# Altium integrated library Weidmueller_OMNIMATE_Signal.IntLib: 2550 symbols (part 11 of 45) (continued)
## 1440400000_Single (continued)
OMNIMATE Signal - series RSV; PartNumber: 1440400000; Manufacturer: Weidmueller; Short_text_for_material: RSV1,6 LS4 GR 3,2 AU; Side_termination_characteristic: closed side; Mounting_onto_the_PCB: Solder connection; Pitch_mm: 5 mm; Pitch_inch: 0.197 inch; No_of_poles: 4; Outgoing_elbow: 180°; Solder_pin_length_mm: 3.2 mm; Contact_material: Cu-Leg; Contact_surface: Gold-plated; Insulating_material: Wemid (PA); UL_94_flammability_rating: V-0; Rated_voltage_for_surge_voltage_class_pollution_degree_II_2: 500 V; Rated_current_min_no_of_poles_TU_20_deg_C: 32 A; PackageReference: RSV1_6_LS_04; Colour: Pebble grey; Packaging: Box; Qty: 100 PCS; Revision: V1; ComponentLink1Description: Manufacturer URL; ComponentLink1URL: http://www.weidmueller.com/; ComponentLink2Description: URL Link1; ComponentLink2URL: http://catalog.weidmueller.com/catalog/Start.do?localeId=en&ObjectID=1440400000
footprint RSV1_6_LS_04 (OMNIMATE Signal - Serie RSV  RSV1,6 LS4 GR 3,2)
part A pins: A1
part B pins: A2
part C pins: A3
part D pins: A4

## 1440500000
designator J?
OMNIMATE Signal - series RSV; PartNumber: 1440500000; Manufacturer: Weidmueller; Short_text_for_material: RSV1,6 LS4 GR 3,2 SN; Side_termination_characteristic: closed side; Mounting_onto_the_PCB: Solder connection; Pitch_mm: 5 mm; Pitch_inch: 0.197 inch; No_of_poles: 4; Outgoing_elbow: 180°; Solder_pin_length_mm: 3.2 mm; Contact_material: Cu-Leg; Contact_surface: tinned; Insulating_material: Wemid (PA); UL_94_flammability_rating: V-0; Rated_voltage_for_surge_voltage_class_pollution_degree_II_2: 500 V; Rated_current_min_no_of_poles_TU_20_deg_C: 32 A; PackageReference: RSV1_6_LS_04; Colour: Pebble grey; Packaging: Box; Qty: 100 PCS; Revision: V1; ComponentLink1Description: Manufacturer URL; ComponentLink1URL: http://www.weidmueller.com/; ComponentLink2Description: URL Link1; ComponentLink2URL: http://catalog.weidmueller.com/catalog/Start.do?localeId=en&ObjectID=1440500000
footprint RSV1_6_LS_04 (OMNIMATE Signal - Serie RSV  RSV1,6 LS4 GR 3,2)
pins: A1, A2, A3, A4

## 1440500000_Single
designator J?
OMNIMATE Signal - series RSV; PartNumber: 1440500000; Manufacturer: Weidmueller; Short_text_for_material: RSV1,6 LS4 GR 3,2 SN; Side_termination_characteristic: closed side; Mounting_onto_the_PCB: Solder connection; Pitch_mm: 5 mm; Pitch_inch: 0.197 inch; No_of_poles: 4; Outgoing_elbow: 180°; Solder_pin_length_mm: 3.2 mm; Contact_material: Cu-Leg; Contact_surface: tinned; Insulating_material: Wemid (PA); UL_94_flammability_rating: V-0; Rated_voltage_for_surge_voltage_class_pollution_degree_II_2: 500 V; Rated_current_min_no_of_poles_TU_20_deg_C: 32 A; PackageReference: RSV1_6_LS_04; Colour: Pebble grey; Packaging: Box; Qty: 100 PCS; Revision: V1; ComponentLink1Description: Manufacturer URL; ComponentLink1URL: http://www.weidmueller.com/; ComponentLink2Description: URL Link1; ComponentLink2URL: http://catalog.weidmueller.com/catalog/Start.do?localeId=en&ObjectID=1440500000
footprint RSV1_6_LS_04 (OMNIMATE Signal - Serie RSV  RSV1,6 LS4 GR 3,2)
part A pins: A1
part B pins: A2
part C pins: A3
part D pins: A4

## 1440600000
designator J?
OMNIMATE Signal - series RSV; PartNumber: 1440600000; Manufacturer: Weidmueller; Short_text_for_material: RSV1,6 LBF4 GR 3,2 AU; Pitch_mm: 5 mm; Pitch_inch: 0.197 inch; No_of_poles: 4; Solder_pin_length_mm: 3.2 mm; Contact_material: Cu-Leg; Contact_surface: Gold-plated; Insulating_material: Wemid (PA); UL_94_flammability_rating: V-0; Rated_voltage_for_surge_voltage_class_pollution_degree_II_2: 500 V; Rated_current_min_no_of_poles_TU_20_deg_C: 32 A; PackageReference: RSV1_6_LBF_04; Colour: Pebble grey; Packaging: Box; Qty: 100 PCS; Revision: V1; ComponentLink1Description: Manufacturer URL; ComponentLink1URL: http://www.weidmueller.com/; ComponentLink2Description: URL Link1; ComponentLink2URL: http://catalog.weidmueller.com/catalog/Start.do?localeId=en&ObjectID=1440600000
footprint RSV1_6_LBF_04 (OMNIMATE Signal - Serie RSV  RSV1,6 LBF4 GR 3,2)
pins: A1, A2, A3, A4

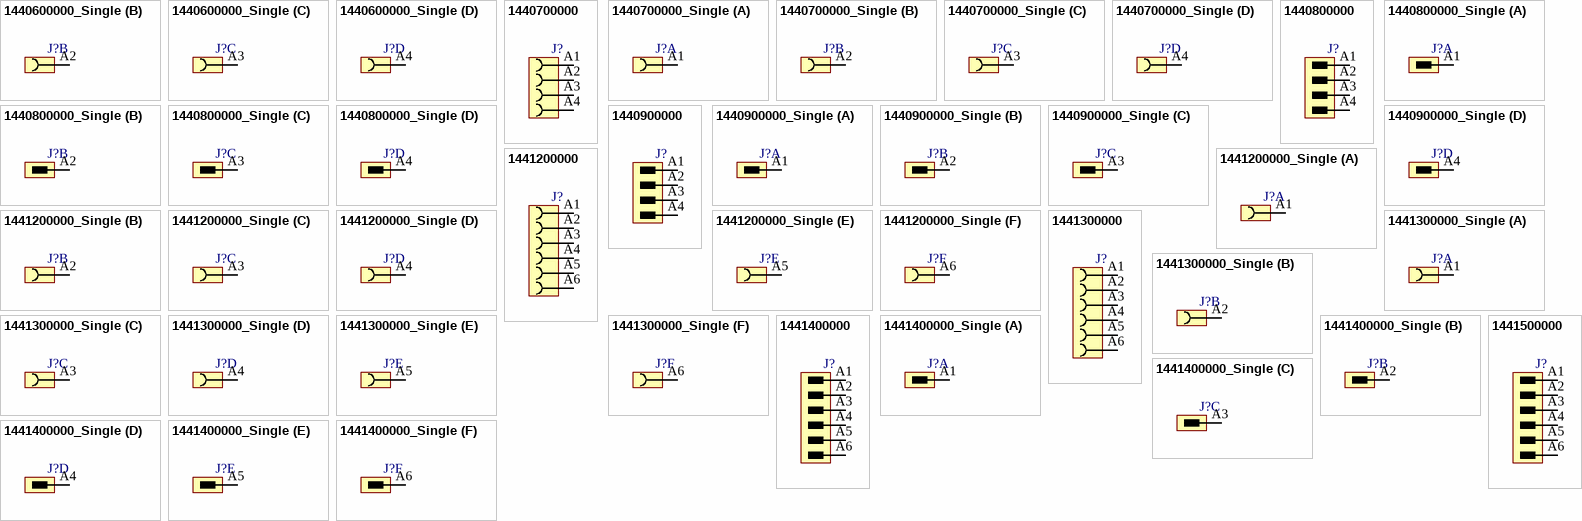
[diagram p63: symbols 1440600000_Single to 1441500000]

## 1440600000_Single
designator J?
OMNIMATE Signal - series RSV; PartNumber: 1440600000; Manufacturer: Weidmueller; Short_text_for_material: RSV1,6 LBF4 GR 3,2 AU; Pitch_mm: 5 mm; Pitch_inch: 0.197 inch; No_of_poles: 4; Solder_pin_length_mm: 3.2 mm; Contact_material: Cu-Leg; Contact_surface: Gold-plated; Insulating_material: Wemid (PA); UL_94_flammability_rating: V-0; Rated_voltage_for_surge_voltage_class_pollution_degree_II_2: 500 V; Rated_current_min_no_of_poles_TU_20_deg_C: 32 A; PackageReference: RSV1_6_LBF_04; Colour: Pebble grey; Packaging: Box; Qty: 100 PCS; Revision: V1; ComponentLink1Description: Manufacturer URL; ComponentLink1URL: http://www.weidmueller.com/; ComponentLink2Description: URL Link1; ComponentLink2URL: http://catalog.weidmueller.com/catalog/Start.do?localeId=en&ObjectID=1440600000
footprint RSV1_6_LBF_04 (OMNIMATE Signal - Serie RSV  RSV1,6 LBF4 GR 3,2)
part A pins: A1
part B pins: A2
part C pins: A3
part D pins: A4

## 1440700000
designator J?
OMNIMATE Signal - series RSV; PartNumber: 1440700000; Manufacturer: Weidmueller; Short_text_for_material: RSV1,6 LBF4 GR 3,2 SN; Pitch_mm: 5 mm; Pitch_inch: 0.197 inch; No_of_poles: 4; Solder_pin_length_mm: 3.2 mm; Contact_material: Cu-Leg; Contact_surface: tinned; Insulating_material: Wemid (PA); UL_94_flammability_rating: V-0; Rated_voltage_for_surge_voltage_class_pollution_degree_II_2: 500 V; Rated_current_min_no_of_poles_TU_20_deg_C: 32 A; PackageReference: RSV1_6_LBF_04; Colour: Pebble grey; Packaging: Box; Qty: 100 PCS; Revision: V1; ComponentLink1Description: Manufacturer URL; ComponentLink1URL: http://www.weidmueller.com/; ComponentLink2Description: URL Link1; ComponentLink2URL: http://catalog.weidmueller.com/catalog/Start.do?localeId=en&ObjectID=1440700000
footprint RSV1_6_LBF_04 (OMNIMATE Signal - Serie RSV  RSV1,6 LBF4 GR 3,2)
pins: A1, A2, A3, A4

## 1440700000_Single
designator J?
OMNIMATE Signal - series RSV; PartNumber: 1440700000; Manufacturer: Weidmueller; Short_text_for_material: RSV1,6 LBF4 GR 3,2 SN; Pitch_mm: 5 mm; Pitch_inch: 0.197 inch; No_of_poles: 4; Solder_pin_length_mm: 3.2 mm; Contact_material: Cu-Leg; Contact_surface: tinned; Insulating_material: Wemid (PA); UL_94_flammability_rating: V-0; Rated_voltage_for_surge_voltage_class_pollution_degree_II_2: 500 V; Rated_current_min_no_of_poles_TU_20_deg_C: 32 A; PackageReference: RSV1_6_LBF_04; Colour: Pebble grey; Packaging: Box; Qty: 100 PCS; Revision: V1; ComponentLink1Description: Manufacturer URL; ComponentLink1URL: http://www.weidmueller.com/; ComponentLink2Description: URL Link1; ComponentLink2URL: http://catalog.weidmueller.com/catalog/Start.do?localeId=en&ObjectID=1440700000
footprint RSV1_6_LBF_04 (OMNIMATE Signal - Serie RSV  RSV1,6 LBF4 GR 3,2)
part A pins: A1
part B pins: A2
part C pins: A3
part D pins: A4

## 1440800000
designator J?
OMNIMATE Signal - series RSV; PartNumber: 1440800000; Manufacturer: Weidmueller; Short_text_for_material: RSV1,6 LSF4 GR 3,2 AU; Side_termination_characteristic: Flange; Mounting_onto_the_PCB: Solder connection; Pitch_mm: 5 mm; Pitch_inch: 0.197 inch; No_of_poles: 4; Outgoing_elbow: 180°; Solder_pin_length_mm: 3.2 mm; Contact_material: Cu-Leg; Contact_surface: Gold-plated; Insulating_material: Wemid (PA); UL_94_flammability_rating: V-0; Rated_voltage_for_surge_voltage_class_pollution_degree_II_2: 500 V; Rated_current_min_no_of_poles_TU_20_deg_C: 32 A; PackageReference: RSV1_6_LSF_04; Colour: Pebble grey; Packaging: Box; Qty: 100 PCS; Revision: V1; ComponentLink1Description: Manufacturer URL; ComponentLink1URL: http://www.weidmueller.com/; ComponentLink2Description: URL Link1; ComponentLink2URL: http://catalog.weidmueller.com/catalog/Start.do?localeId=en&ObjectID=1440800000
footprint RSV1_6_LSF_04 (OMNIMATE Signal - Serie RSV  RSV1,6 LSF4 GR 3,2)
pins: A1, A2, A3, A4

## 1440800000_Single
designator J?
OMNIMATE Signal - series RSV; PartNumber: 1440800000; Manufacturer: Weidmueller; Short_text_for_material: RSV1,6 LSF4 GR 3,2 AU; Side_termination_characteristic: Flange; Mounting_onto_the_PCB: Solder connection; Pitch_mm: 5 mm; Pitch_inch: 0.197 inch; No_of_poles: 4; Outgoing_elbow: 180°; Solder_pin_length_mm: 3.2 mm; Contact_material: Cu-Leg; Contact_surface: Gold-plated; Insulating_material: Wemid (PA); UL_94_flammability_rating: V-0; Rated_voltage_for_surge_voltage_class_pollution_degree_II_2: 500 V; Rated_current_min_no_of_poles_TU_20_deg_C: 32 A; PackageReference: RSV1_6_LSF_04; Colour: Pebble grey; Packaging: Box; Qty: 100 PCS; Revision: V1; ComponentLink1Description: Manufacturer URL; ComponentLink1URL: http://www.weidmueller.com/; ComponentLink2Description: URL Link1; ComponentLink2URL: http://catalog.weidmueller.com/catalog/Start.do?localeId=en&ObjectID=1440800000
footprint RSV1_6_LSF_04 (OMNIMATE Signal - Serie RSV  RSV1,6 LSF4 GR 3,2)
part A pins: A1
part B pins: A2
part C pins: A3
part D pins: A4

## 1440900000
designator J?
OMNIMATE Signal - series RSV; PartNumber: 1440900000; Manufacturer: Weidmueller; Short_text_for_material: RSV1,6 LSF4 GR 3,2 SN; Side_termination_characteristic: Flange; Mounting_onto_the_PCB: Solder connection; Pitch_mm: 5 mm; Pitch_inch: 0.197 inch; No_of_poles: 4; Outgoing_elbow: 180°; Solder_pin_length_mm: 3.2 mm; Contact_material: Cu-Leg; Contact_surface: tinned; Insulating_material: Wemid (PA); UL_94_flammability_rating: V-0; Rated_voltage_for_surge_voltage_class_pollution_degree_II_2: 500 V; Rated_current_min_no_of_poles_TU_20_deg_C: 32 A; PackageReference: RSV1_6_LSF_04; Colour: Pebble grey; Packaging: Box; Qty: 100 PCS; Revision: V1; ComponentLink1Description: Manufacturer URL; ComponentLink1URL: http://www.weidmueller.com/; ComponentLink2Description: URL Link1; ComponentLink2URL: http://catalog.weidmueller.com/catalog/Start.do?localeId=en&ObjectID=1440900000
footprint RSV1_6_LSF_04 (OMNIMATE Signal - Serie RSV  RSV1,6 LSF4 GR 3,2)
pins: A1, A2, A3, A4

## 1440900000_Single
designator J?
OMNIMATE Signal - series RSV; PartNumber: 1440900000; Manufacturer: Weidmueller; Short_text_for_material: RSV1,6 LSF4 GR 3,2 SN; Side_termination_characteristic: Flange; Mounting_onto_the_PCB: Solder connection; Pitch_mm: 5 mm; Pitch_inch: 0.197 inch; No_of_poles: 4; Outgoing_elbow: 180°; Solder_pin_length_mm: 3.2 mm; Contact_material: Cu-Leg; Contact_surface: tinned; Insulating_material: Wemid (PA); UL_94_flammability_rating: V-0; Rated_voltage_for_surge_voltage_class_pollution_degree_II_2: 500 V; Rated_current_min_no_of_poles_TU_20_deg_C: 32 A; PackageReference: RSV1_6_LSF_04; Colour: Pebble grey; Packaging: Box; Qty: 100 PCS; Revision: V1; ComponentLink1Description: Manufacturer URL; ComponentLink1URL: http://www.weidmueller.com/; ComponentLink2Description: URL Link1; ComponentLink2URL: http://catalog.weidmueller.com/catalog/Start.do?localeId=en&ObjectID=1440900000
footprint RSV1_6_LSF_04 (OMNIMATE Signal - Serie RSV  RSV1,6 LSF4 GR 3,2)
part A pins: A1
part B pins: A2
part C pins: A3
part D pins: A4

## 1441200000
designator J?
OMNIMATE Signal - series RSV; PartNumber: 1441200000; Manufacturer: Weidmueller; Short_text_for_material: RSV1,6 LB6 GR 3,2 AU; Pitch_mm: 5 mm; Pitch_inch: 0.197 inch; No_of_poles: 6; Solder_pin_length_mm: 3.2 mm; Contact_material: Cu-Leg; Contact_surface: Gold-plated; Insulating_material: Wemid (PA); UL_94_flammability_rating: V-0; Rated_voltage_for_surge_voltage_class_pollution_degree_II_2: 500 V; Rated_current_min_no_of_poles_TU_20_deg_C: 32 A; PackageReference: RSV1_6_LB_06; Colour: Pebble grey; Packaging: Box; Qty: 50 PCS; Revision: V1; ComponentLink1Description: Manufacturer URL; ComponentLink1URL: http://www.weidmueller.com/; ComponentLink2Description: URL Link1; ComponentLink2URL: http://catalog.weidmueller.com/catalog/Start.do?localeId=en&ObjectID=1441200000
footprint RSV1_6_LB_06 (OMNIMATE Signal - Serie RSV  RSV1,6 LB6 GR 3,2)
pins: A1, A2, A3, A4, A5, A6

## 1441200000_Single
designator J?
OMNIMATE Signal - series RSV; PartNumber: 1441200000; Manufacturer: Weidmueller; Short_text_for_material: RSV1,6 LB6 GR 3,2 AU; Pitch_mm: 5 mm; Pitch_inch: 0.197 inch; No_of_poles: 6; Solder_pin_length_mm: 3.2 mm; Contact_material: Cu-Leg; Contact_surface: Gold-plated; Insulating_material: Wemid (PA); UL_94_flammability_rating: V-0; Rated_voltage_for_surge_voltage_class_pollution_degree_II_2: 500 V; Rated_current_min_no_of_poles_TU_20_deg_C: 32 A; PackageReference: RSV1_6_LB_06; Colour: Pebble grey; Packaging: Box; Qty: 50 PCS; Revision: V1; ComponentLink1Description: Manufacturer URL; ComponentLink1URL: http://www.weidmueller.com/; ComponentLink2Description: URL Link1; ComponentLink2URL: http://catalog.weidmueller.com/catalog/Start.do?localeId=en&ObjectID=1441200000
footprint RSV1_6_LB_06 (OMNIMATE Signal - Serie RSV  RSV1,6 LB6 GR 3,2)
part A pins: A1
part B pins: A2
part C pins: A3
part D pins: A4
part E pins: A5
part F pins: A6

## 1441300000
designator J?
OMNIMATE Signal - series RSV; PartNumber: 1441300000; Manufacturer: Weidmueller; Short_text_for_material: RSV1,6 LB6 GR 3,2 SN; Pitch_mm: 5 mm; Pitch_inch: 0.197 inch; No_of_poles: 6; Solder_pin_length_mm: 3.2 mm; Contact_material: Cu-Leg; Contact_surface: tinned; Insulating_material: Wemid (PA); UL_94_flammability_rating: V-0; Rated_voltage_for_surge_voltage_class_pollution_degree_II_2: 500 V; Rated_current_min_no_of_poles_TU_20_deg_C: 32 A; PackageReference: RSV1_6_LB_06; Colour: Pebble grey; Packaging: Box; Qty: 50 PCS; Revision: V1; ComponentLink1Description: Manufacturer URL; ComponentLink1URL: http://www.weidmueller.com/; ComponentLink2Description: URL Link1; ComponentLink2URL: http://catalog.weidmueller.com/catalog/Start.do?localeId=en&ObjectID=1441300000
footprint RSV1_6_LB_06 (OMNIMATE Signal - Serie RSV  RSV1,6 LB6 GR 3,2)
pins: A1, A2, A3, A4, A5, A6

## 1441300000_Single
designator J?
OMNIMATE Signal - series RSV; PartNumber: 1441300000; Manufacturer: Weidmueller; Short_text_for_material: RSV1,6 LB6 GR 3,2 SN; Pitch_mm: 5 mm; Pitch_inch: 0.197 inch; No_of_poles: 6; Solder_pin_length_mm: 3.2 mm; Contact_material: Cu-Leg; Contact_surface: tinned; Insulating_material: Wemid (PA); UL_94_flammability_rating: V-0; Rated_voltage_for_surge_voltage_class_pollution_degree_II_2: 500 V; Rated_current_min_no_of_poles_TU_20_deg_C: 32 A; PackageReference: RSV1_6_LB_06; Colour: Pebble grey; Packaging: Box; Qty: 50 PCS; Revision: V1; ComponentLink1Description: Manufacturer URL; ComponentLink1URL: http://www.weidmueller.com/; ComponentLink2Description: URL Link1; ComponentLink2URL: http://catalog.weidmueller.com/catalog/Start.do?localeId=en&ObjectID=1441300000
footprint RSV1_6_LB_06 (OMNIMATE Signal - Serie RSV  RSV1,6 LB6 GR 3,2)
part A pins: A1
part B pins: A2
part C pins: A3
part D pins: A4
part E pins: A5
part F pins: A6

## 1441400000
designator J?
OMNIMATE Signal - series RSV; PartNumber: 1441400000; Manufacturer: Weidmueller; Short_text_for_material: RSV1,6 LS6 GR 3,2 AU; Side_termination_characteristic: closed side; Mounting_onto_the_PCB: Solder connection; Pitch_mm: 5 mm; Pitch_inch: 0.197 inch; No_of_poles: 6; Outgoing_elbow: 180°; Solder_pin_length_mm: 3.2 mm; Contact_material: Cu-Leg; Contact_surface: Gold-plated; Insulating_material: Wemid (PA); UL_94_flammability_rating: V-0; Rated_voltage_for_surge_voltage_class_pollution_degree_II_2: 500 V; Rated_current_min_no_of_poles_TU_20_deg_C: 32 A; PackageReference: RSV1_6_LS_06; Colour: Pebble grey; Packaging: Box; Qty: 50 PCS; Revision: V1; ComponentLink1Description: Manufacturer URL; ComponentLink1URL: http://www.weidmueller.com/; ComponentLink2Description: URL Link1; ComponentLink2URL: http://catalog.weidmueller.com/catalog/Start.do?localeId=en&ObjectID=1441400000
footprint RSV1_6_LS_06 (OMNIMATE Signal - Serie RSV  RSV1,6 LS6 GR 3,2)
pins: A1, A2, A3, A4, A5, A6

## 1441400000_Single
designator J?
OMNIMATE Signal - series RSV; PartNumber: 1441400000; Manufacturer: Weidmueller; Short_text_for_material: RSV1,6 LS6 GR 3,2 AU; Side_termination_characteristic: closed side; Mounting_onto_the_PCB: Solder connection; Pitch_mm: 5 mm; Pitch_inch: 0.197 inch; No_of_poles: 6; Outgoing_elbow: 180°; Solder_pin_length_mm: 3.2 mm; Contact_material: Cu-Leg; Contact_surface: Gold-plated; Insulating_material: Wemid (PA); UL_94_flammability_rating: V-0; Rated_voltage_for_surge_voltage_class_pollution_degree_II_2: 500 V; Rated_current_min_no_of_poles_TU_20_deg_C: 32 A; PackageReference: RSV1_6_LS_06; Colour: Pebble grey; Packaging: Box; Qty: 50 PCS; Revision: V1; ComponentLink1Description: Manufacturer URL; ComponentLink1URL: http://www.weidmueller.com/; ComponentLink2Description: URL Link1; ComponentLink2URL: http://catalog.weidmueller.com/catalog/Start.do?localeId=en&ObjectID=1441400000
footprint RSV1_6_LS_06 (OMNIMATE Signal - Serie RSV  RSV1,6 LS6 GR 3,2)
part A pins: A1
part B pins: A2
part C pins: A3
part D pins: A4
part E pins: A5
part F pins: A6

## 1441500000
designator J?
OMNIMATE Signal - series RSV; PartNumber: 1441500000; Manufacturer: Weidmueller; Short_text_for_material: RSV1,6 LS6 GR 3,2 SN; Side_termination_characteristic: closed side; Mounting_onto_the_PCB: Solder connection; Pitch_mm: 5 mm; Pitch_inch: 0.197 inch; No_of_poles: 6; Outgoing_elbow: 180°; Solder_pin_length_mm: 3.2 mm; Contact_material: Cu-Leg; Contact_surface: tinned; Insulating_material: Wemid (PA); UL_94_flammability_rating: V-0; Rated_voltage_for_surge_voltage_class_pollution_degree_II_2: 500 V; Rated_current_min_no_of_poles_TU_20_deg_C: 32 A; PackageReference: RSV1_6_LS_06; Colour: Pebble grey; Packaging: Box; Qty: 50 PCS; Revision: V1; ComponentLink1Description: Manufacturer URL; ComponentLink1URL: http://www.weidmueller.com/; ComponentLink2Description: URL Link1; ComponentLink2URL: http://catalog.weidmueller.com/catalog/Start.do?localeId=en&ObjectID=1441500000
footprint RSV1_6_LS_06 (OMNIMATE Signal - Serie RSV  RSV1,6 LS6 GR 3,2)
pins: A1, A2, A3, A4, A5, A6

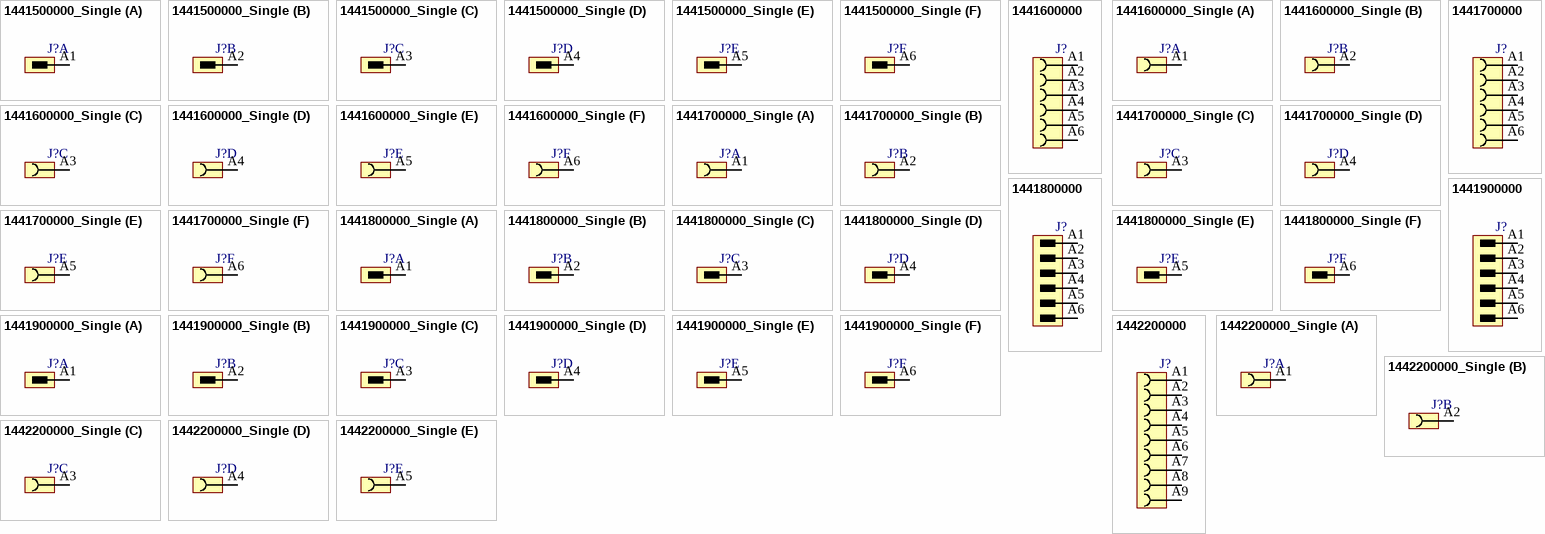
[diagram p64: symbols 1441500000_Single to 1442200000_Single]

## 1441500000_Single
designator J?
OMNIMATE Signal - series RSV; PartNumber: 1441500000; Manufacturer: Weidmueller; Short_text_for_material: RSV1,6 LS6 GR 3,2 SN; Side_termination_characteristic: closed side; Mounting_onto_the_PCB: Solder connection; Pitch_mm: 5 mm; Pitch_inch: 0.197 inch; No_of_poles: 6; Outgoing_elbow: 180°; Solder_pin_length_mm: 3.2 mm; Contact_material: Cu-Leg; Contact_surface: tinned; Insulating_material: Wemid (PA); UL_94_flammability_rating: V-0; Rated_voltage_for_surge_voltage_class_pollution_degree_II_2: 500 V; Rated_current_min_no_of_poles_TU_20_deg_C: 32 A; PackageReference: RSV1_6_LS_06; Colour: Pebble grey; Packaging: Box; Qty: 50 PCS; Revision: V1; ComponentLink1Description: Manufacturer URL; ComponentLink1URL: http://www.weidmueller.com/; ComponentLink2Description: URL Link1; ComponentLink2URL: http://catalog.weidmueller.com/catalog/Start.do?localeId=en&ObjectID=1441500000
footprint RSV1_6_LS_06 (OMNIMATE Signal - Serie RSV  RSV1,6 LS6 GR 3,2)
part A pins: A1
part B pins: A2
part C pins: A3
part D pins: A4
part E pins: A5
part F pins: A6

## 1441600000
designator J?
OMNIMATE Signal - series RSV; PartNumber: 1441600000; Manufacturer: Weidmueller; Short_text_for_material: RSV1,6 LBF6 GR 3,2 AU; Pitch_mm: 5 mm; Pitch_inch: 0.197 inch; No_of_poles: 6; Solder_pin_length_mm: 3.2 mm; Contact_material: Cu-Leg; Contact_surface: Gold-plated; Insulating_material: Wemid (PA); UL_94_flammability_rating: V-0; Rated_voltage_for_surge_voltage_class_pollution_degree_II_2: 500 V; Rated_current_min_no_of_poles_TU_20_deg_C: 32 A; PackageReference: RSV1_6_LBF_06; Colour: Pebble grey; Packaging: Box; Qty: 50 PCS; Revision: V1; ComponentLink1Description: Manufacturer URL; ComponentLink1URL: http://www.weidmueller.com/; ComponentLink2Description: URL Link1; ComponentLink2URL: http://catalog.weidmueller.com/catalog/Start.do?localeId=en&ObjectID=1441600000
footprint RSV1_6_LBF_06 (OMNIMATE Signal - Serie RSV  RSV1,6 LB6 GR 3,2)
pins: A1, A2, A3, A4, A5, A6

## 1441600000_Single
designator J?
OMNIMATE Signal - series RSV; PartNumber: 1441600000; Manufacturer: Weidmueller; Short_text_for_material: RSV1,6 LBF6 GR 3,2 AU; Pitch_mm: 5 mm; Pitch_inch: 0.197 inch; No_of_poles: 6; Solder_pin_length_mm: 3.2 mm; Contact_material: Cu-Leg; Contact_surface: Gold-plated; Insulating_material: Wemid (PA); UL_94_flammability_rating: V-0; Rated_voltage_for_surge_voltage_class_pollution_degree_II_2: 500 V; Rated_current_min_no_of_poles_TU_20_deg_C: 32 A; PackageReference: RSV1_6_LBF_06; Colour: Pebble grey; Packaging: Box; Qty: 50 PCS; Revision: V1; ComponentLink1Description: Manufacturer URL; ComponentLink1URL: http://www.weidmueller.com/; ComponentLink2Description: URL Link1; ComponentLink2URL: http://catalog.weidmueller.com/catalog/Start.do?localeId=en&ObjectID=1441600000
footprint RSV1_6_LBF_06 (OMNIMATE Signal - Serie RSV  RSV1,6 LB6 GR 3,2)
part A pins: A1
part B pins: A2
part C pins: A3
part D pins: A4
part E pins: A5
part F pins: A6

## 1441700000
designator J?
OMNIMATE Signal - series RSV; PartNumber: 1441700000; Manufacturer: Weidmueller; Short_text_for_material: RSV1,6 LBF6 GR 3,2 SN; Pitch_mm: 5 mm; Pitch_inch: 0.197 inch; No_of_poles: 6; Solder_pin_length_mm: 3.2 mm; Contact_material: Cu-Leg; Contact_surface: tinned; Insulating_material: Wemid (PA); UL_94_flammability_rating: V-0; Rated_voltage_for_surge_voltage_class_pollution_degree_II_2: 500 V; Rated_current_min_no_of_poles_TU_20_deg_C: 32 A; PackageReference: RSV1_6_LBF_06; Colour: Pebble grey; Packaging: Box; Qty: 50 PCS; Revision: V1; ComponentLink1Description: Manufacturer URL; ComponentLink1URL: http://www.weidmueller.com/; ComponentLink2Description: URL Link1; ComponentLink2URL: http://catalog.weidmueller.com/catalog/Start.do?localeId=en&ObjectID=1441700000
footprint RSV1_6_LBF_06 (OMNIMATE Signal - Serie RSV  RSV1,6 LB6 GR 3,2)
pins: A1, A2, A3, A4, A5, A6

## 1441700000_Single
designator J?
OMNIMATE Signal - series RSV; PartNumber: 1441700000; Manufacturer: Weidmueller; Short_text_for_material: RSV1,6 LBF6 GR 3,2 SN; Pitch_mm: 5 mm; Pitch_inch: 0.197 inch; No_of_poles: 6; Solder_pin_length_mm: 3.2 mm; Contact_material: Cu-Leg; Contact_surface: tinned; Insulating_material: Wemid (PA); UL_94_flammability_rating: V-0; Rated_voltage_for_surge_voltage_class_pollution_degree_II_2: 500 V; Rated_current_min_no_of_poles_TU_20_deg_C: 32 A; PackageReference: RSV1_6_LBF_06; Colour: Pebble grey; Packaging: Box; Qty: 50 PCS; Revision: V1; ComponentLink1Description: Manufacturer URL; ComponentLink1URL: http://www.weidmueller.com/; ComponentLink2Description: URL Link1; ComponentLink2URL: http://catalog.weidmueller.com/catalog/Start.do?localeId=en&ObjectID=1441700000
footprint RSV1_6_LBF_06 (OMNIMATE Signal - Serie RSV  RSV1,6 LB6 GR 3,2)
part A pins: A1
part B pins: A2
part C pins: A3
part D pins: A4
part E pins: A5
part F pins: A6

## 1441800000
designator J?
OMNIMATE Signal - series RSV; PartNumber: 1441800000; Manufacturer: Weidmueller; Short_text_for_material: RSV1,6 LSF6 GR 3,2 AU; Side_termination_characteristic: Flange; Mounting_onto_the_PCB: Solder connection; Pitch_mm: 5 mm; Pitch_inch: 0.197 inch; No_of_poles: 6; Outgoing_elbow: 180°; Solder_pin_length_mm: 3.2 mm; Contact_material: Cu-Leg; Contact_surface: Gold-plated; Insulating_material: Wemid (PA); UL_94_flammability_rating: V-0; Rated_voltage_for_surge_voltage_class_pollution_degree_II_2: 500 V; Rated_current_min_no_of_poles_TU_20_deg_C: 32 A; PackageReference: RSV1_6_LSF_06; Colour: Pebble grey; Packaging: Box; Qty: 50 PCS; Revision: V1; ComponentLink1Description: Manufacturer URL; ComponentLink1URL: http://www.weidmueller.com/; ComponentLink2Description: URL Link1; ComponentLink2URL: http://catalog.weidmueller.com/catalog/Start.do?localeId=en&ObjectID=1441800000
footprint RSV1_6_LSF_06 (OMNIMATE Signal - Serie RSV  RSV1,6 LSF6 GR 3,2)
pins: A1, A2, A3, A4, A5, A6

## 1441800000_Single
designator J?
OMNIMATE Signal - series RSV; PartNumber: 1441800000; Manufacturer: Weidmueller; Short_text_for_material: RSV1,6 LSF6 GR 3,2 AU; Side_termination_characteristic: Flange; Mounting_onto_the_PCB: Solder connection; Pitch_mm: 5 mm; Pitch_inch: 0.197 inch; No_of_poles: 6; Outgoing_elbow: 180°; Solder_pin_length_mm: 3.2 mm; Contact_material: Cu-Leg; Contact_surface: Gold-plated; Insulating_material: Wemid (PA); UL_94_flammability_rating: V-0; Rated_voltage_for_surge_voltage_class_pollution_degree_II_2: 500 V; Rated_current_min_no_of_poles_TU_20_deg_C: 32 A; PackageReference: RSV1_6_LSF_06; Colour: Pebble grey; Packaging: Box; Qty: 50 PCS; Revision: V1; ComponentLink1Description: Manufacturer URL; ComponentLink1URL: http://www.weidmueller.com/; ComponentLink2Description: URL Link1; ComponentLink2URL: http://catalog.weidmueller.com/catalog/Start.do?localeId=en&ObjectID=1441800000
footprint RSV1_6_LSF_06 (OMNIMATE Signal - Serie RSV  RSV1,6 LSF6 GR 3,2)
part A pins: A1
part B pins: A2
part C pins: A3
part D pins: A4
part E pins: A5
part F pins: A6

## 1441900000
designator J?
OMNIMATE Signal - series RSV; PartNumber: 1441900000; Manufacturer: Weidmueller; Short_text_for_material: RSV1,6 LSF6 GR 3,2 SN; Side_termination_characteristic: Flange; Mounting_onto_the_PCB: Solder connection; Pitch_mm: 5 mm; Pitch_inch: 0.197 inch; No_of_poles: 6; Outgoing_elbow: 180°; Solder_pin_length_mm: 3.2 mm; Contact_material: Cu-Leg; Contact_surface: tinned; Insulating_material: Wemid (PA); UL_94_flammability_rating: V-0; Rated_voltage_for_surge_voltage_class_pollution_degree_II_2: 500 V; Rated_current_min_no_of_poles_TU_20_deg_C: 32 A; PackageReference: RSV1_6_LSF_06; Colour: Pebble grey; Packaging: Box; Qty: 50 PCS; Revision: V1; ComponentLink1Description: Manufacturer URL; ComponentLink1URL: http://www.weidmueller.com/; ComponentLink2Description: URL Link1; ComponentLink2URL: http://catalog.weidmueller.com/catalog/Start.do?localeId=en&ObjectID=1441900000
footprint RSV1_6_LSF_06 (OMNIMATE Signal - Serie RSV  RSV1,6 LSF6 GR 3,2)
pins: A1, A2, A3, A4, A5, A6

## 1441900000_Single
designator J?
OMNIMATE Signal - series RSV; PartNumber: 1441900000; Manufacturer: Weidmueller; Short_text_for_material: RSV1,6 LSF6 GR 3,2 SN; Side_termination_characteristic: Flange; Mounting_onto_the_PCB: Solder connection; Pitch_mm: 5 mm; Pitch_inch: 0.197 inch; No_of_poles: 6; Outgoing_elbow: 180°; Solder_pin_length_mm: 3.2 mm; Contact_material: Cu-Leg; Contact_surface: tinned; Insulating_material: Wemid (PA); UL_94_flammability_rating: V-0; Rated_voltage_for_surge_voltage_class_pollution_degree_II_2: 500 V; Rated_current_min_no_of_poles_TU_20_deg_C: 32 A; PackageReference: RSV1_6_LSF_06; Colour: Pebble grey; Packaging: Box; Qty: 50 PCS; Revision: V1; ComponentLink1Description: Manufacturer URL; ComponentLink1URL: http://www.weidmueller.com/; ComponentLink2Description: URL Link1; ComponentLink2URL: http://catalog.weidmueller.com/catalog/Start.do?localeId=en&ObjectID=1441900000
footprint RSV1_6_LSF_06 (OMNIMATE Signal - Serie RSV  RSV1,6 LSF6 GR 3,2)
part A pins: A1
part B pins: A2
part C pins: A3
part D pins: A4
part E pins: A5
part F pins: A6

## 1442200000
designator J?
OMNIMATE Signal - series RSV; PartNumber: 1442200000; Manufacturer: Weidmueller; Short_text_for_material: RSV1,6 LB9 GR 3,2 AU; Pitch_mm: 5 mm; Pitch_inch: 0.197 inch; No_of_poles: 9; Solder_pin_length_mm: 3.2 mm; Contact_material: Cu-Leg; Contact_surface: Gold-plated; Insulating_material: Wemid (PA); UL_94_flammability_rating: V-0; Rated_voltage_for_surge_voltage_class_pollution_degree_II_2: 500 V; Rated_current_min_no_of_poles_TU_20_deg_C: 32 A; PackageReference: RSV1_6_LB_09; Colour: Pebble grey; Packaging: Box; Qty: 50 PCS; Revision: V1; ComponentLink1Description: Manufacturer URL; ComponentLink1URL: http://www.weidmueller.com/; ComponentLink2Description: URL Link1; ComponentLink2URL: http://catalog.weidmueller.com/catalog/Start.do?localeId=en&ObjectID=1442200000
footprint RSV1_6_LB_09 (OMNIMATE Signal - Serie RSV  RSV1,6 LB9 GR 3,2)
pins: A1, A2, A3, A4, A5, A6, A7, A8, A9

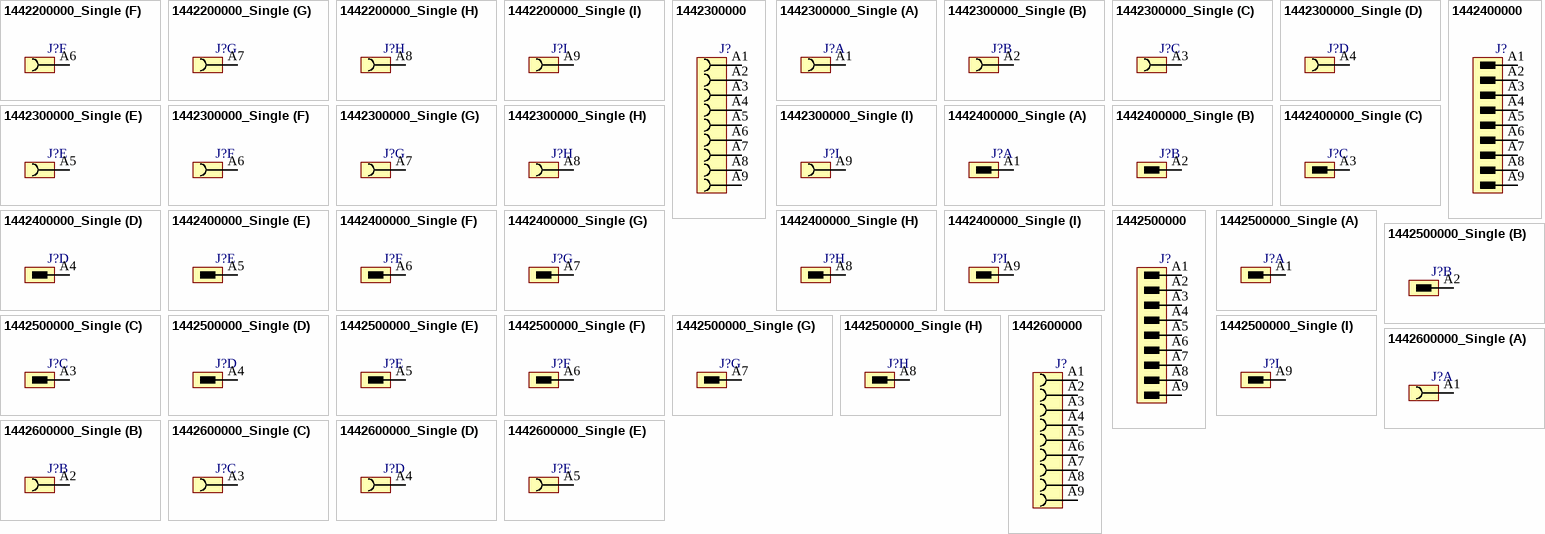
[diagram p65: symbols 1442200000_Single to 1442600000_Single]

## 1442200000_Single
designator J?
OMNIMATE Signal - series RSV; PartNumber: 1442200000; Manufacturer: Weidmueller; Short_text_for_material: RSV1,6 LB9 GR 3,2 AU; Pitch_mm: 5 mm; Pitch_inch: 0.197 inch; No_of_poles: 9; Solder_pin_length_mm: 3.2 mm; Contact_material: Cu-Leg; Contact_surface: Gold-plated; Insulating_material: Wemid (PA); UL_94_flammability_rating: V-0; Rated_voltage_for_surge_voltage_class_pollution_degree_II_2: 500 V; Rated_current_min_no_of_poles_TU_20_deg_C: 32 A; PackageReference: RSV1_6_LB_09; Colour: Pebble grey; Packaging: Box; Qty: 50 PCS; Revision: V1; ComponentLink1Description: Manufacturer URL; ComponentLink1URL: http://www.weidmueller.com/; ComponentLink2Description: URL Link1; ComponentLink2URL: http://catalog.weidmueller.com/catalog/Start.do?localeId=en&ObjectID=1442200000
footprint RSV1_6_LB_09 (OMNIMATE Signal - Serie RSV  RSV1,6 LB9 GR 3,2)
part A pins: A1
part B pins: A2
part C pins: A3
part D pins: A4
part E pins: A5
part F pins: A6
part G pins: A7
part H pins: A8
part I pins: A9

## 1442300000
designator J?
OMNIMATE Signal - series RSV; PartNumber: 1442300000; Manufacturer: Weidmueller; Short_text_for_material: RSV1,6 LB9 GR 3,2 SN; Pitch_mm: 5 mm; Pitch_inch: 0.197 inch; No_of_poles: 9; Solder_pin_length_mm: 3.2 mm; Contact_material: Cu-Leg; Contact_surface: tinned; Insulating_material: Wemid (PA); UL_94_flammability_rating: V-0; Rated_voltage_for_surge_voltage_class_pollution_degree_II_2: 500 V; Rated_current_min_no_of_poles_TU_20_deg_C: 32 A; PackageReference: RSV1_6_LB_09; Colour: Pebble grey; Packaging: Box; Qty: 50 PCS; Revision: V1; ComponentLink1Description: Manufacturer URL; ComponentLink1URL: http://www.weidmueller.com/; ComponentLink2Description: URL Link1; ComponentLink2URL: http://catalog.weidmueller.com/catalog/Start.do?localeId=en&ObjectID=1442300000
footprint RSV1_6_LB_09 (OMNIMATE Signal - Serie RSV  RSV1,6 LB9 GR 3,2)
pins: A1, A2, A3, A4, A5, A6, A7, A8, A9

## 1442300000_Single
designator J?
OMNIMATE Signal - series RSV; PartNumber: 1442300000; Manufacturer: Weidmueller; Short_text_for_material: RSV1,6 LB9 GR 3,2 SN; Pitch_mm: 5 mm; Pitch_inch: 0.197 inch; No_of_poles: 9; Solder_pin_length_mm: 3.2 mm; Contact_material: Cu-Leg; Contact_surface: tinned; Insulating_material: Wemid (PA); UL_94_flammability_rating: V-0; Rated_voltage_for_surge_voltage_class_pollution_degree_II_2: 500 V; Rated_current_min_no_of_poles_TU_20_deg_C: 32 A; PackageReference: RSV1_6_LB_09; Colour: Pebble grey; Packaging: Box; Qty: 50 PCS; Revision: V1; ComponentLink1Description: Manufacturer URL; ComponentLink1URL: http://www.weidmueller.com/; ComponentLink2Description: URL Link1; ComponentLink2URL: http://catalog.weidmueller.com/catalog/Start.do?localeId=en&ObjectID=1442300000
footprint RSV1_6_LB_09 (OMNIMATE Signal - Serie RSV  RSV1,6 LB9 GR 3,2)
part A pins: A1
part B pins: A2
part C pins: A3
part D pins: A4
part E pins: A5
part F pins: A6
part G pins: A7
part H pins: A8
part I pins: A9

## 1442400000
designator J?
OMNIMATE Signal - series RSV; PartNumber: 1442400000; Manufacturer: Weidmueller; Short_text_for_material: RSV1,6 LS9 GR 3,2 AU; Side_termination_characteristic: closed side; Mounting_onto_the_PCB: Solder connection; Pitch_mm: 5 mm; Pitch_inch: 0.197 inch; No_of_poles: 9; Outgoing_elbow: 180°; Solder_pin_length_mm: 3.2 mm; Contact_material: Cu-Leg; Contact_surface: Gold-plated; Insulating_material: Wemid (PA); UL_94_flammability_rating: V-0; Rated_voltage_for_surge_voltage_class_pollution_degree_II_2: 500 V; Rated_current_min_no_of_poles_TU_20_deg_C: 32 A; PackageReference: RSV1_6_LS_09; Colour: Pebble grey; Packaging: Box; Qty: 50 PCS; Revision: V1; ComponentLink1Description: Manufacturer URL; ComponentLink1URL: http://www.weidmueller.com/; ComponentLink2Description: URL Link1; ComponentLink2URL: http://catalog.weidmueller.com/catalog/Start.do?localeId=en&ObjectID=1442400000
footprint RSV1_6_LS_09 (OMNIMATE Signal - Serie RSV  RSV1,6 LS9 GR 3,2)
pins: A1, A2, A3, A4, A5, A6, A7, A8, A9

## 1442400000_Single
designator J?
OMNIMATE Signal - series RSV; PartNumber: 1442400000; Manufacturer: Weidmueller; Short_text_for_material: RSV1,6 LS9 GR 3,2 AU; Side_termination_characteristic: closed side; Mounting_onto_the_PCB: Solder connection; Pitch_mm: 5 mm; Pitch_inch: 0.197 inch; No_of_poles: 9; Outgoing_elbow: 180°; Solder_pin_length_mm: 3.2 mm; Contact_material: Cu-Leg; Contact_surface: Gold-plated; Insulating_material: Wemid (PA); UL_94_flammability_rating: V-0; Rated_voltage_for_surge_voltage_class_pollution_degree_II_2: 500 V; Rated_current_min_no_of_poles_TU_20_deg_C: 32 A; PackageReference: RSV1_6_LS_09; Colour: Pebble grey; Packaging: Box; Qty: 50 PCS; Revision: V1; ComponentLink1Description: Manufacturer URL; ComponentLink1URL: http://www.weidmueller.com/; ComponentLink2Description: URL Link1; ComponentLink2URL: http://catalog.weidmueller.com/catalog/Start.do?localeId=en&ObjectID=1442400000
footprint RSV1_6_LS_09 (OMNIMATE Signal - Serie RSV  RSV1,6 LS9 GR 3,2)
part A pins: A1
part B pins: A2
part C pins: A3
part D pins: A4
part E pins: A5
part F pins: A6
part G pins: A7
part H pins: A8
part I pins: A9

## 1442500000
designator J?
OMNIMATE Signal - series RSV; PartNumber: 1442500000; Manufacturer: Weidmueller; Short_text_for_material: RSV1,6 LS9 GR 3,2 SN; Side_termination_characteristic: closed side; Mounting_onto_the_PCB: Solder connection; Pitch_mm: 5 mm; Pitch_inch: 0.197 inch; No_of_poles: 9; Outgoing_elbow: 180°; Solder_pin_length_mm: 3.2 mm; Contact_material: Cu-Leg; Contact_surface: tinned; Insulating_material: Wemid (PA); UL_94_flammability_rating: V-0; Rated_voltage_for_surge_voltage_class_pollution_degree_II_2: 500 V; Rated_current_min_no_of_poles_TU_20_deg_C: 32 A; PackageReference: RSV1_6_LS_09; Colour: Pebble grey; Packaging: Box; Qty: 50 PCS; Revision: V1; ComponentLink1Description: Manufacturer URL; ComponentLink1URL: http://www.weidmueller.com/; ComponentLink2Description: URL Link1; ComponentLink2URL: http://catalog.weidmueller.com/catalog/Start.do?localeId=en&ObjectID=1442500000
footprint RSV1_6_LS_09 (OMNIMATE Signal - Serie RSV  RSV1,6 LS9 GR 3,2)
pins: A1, A2, A3, A4, A5, A6, A7, A8, A9

## 1442500000_Single
designator J?
OMNIMATE Signal - series RSV; PartNumber: 1442500000; Manufacturer: Weidmueller; Short_text_for_material: RSV1,6 LS9 GR 3,2 SN; Side_termination_characteristic: closed side; Mounting_onto_the_PCB: Solder connection; Pitch_mm: 5 mm; Pitch_inch: 0.197 inch; No_of_poles: 9; Outgoing_elbow: 180°; Solder_pin_length_mm: 3.2 mm; Contact_material: Cu-Leg; Contact_surface: tinned; Insulating_material: Wemid (PA); UL_94_flammability_rating: V-0; Rated_voltage_for_surge_voltage_class_pollution_degree_II_2: 500 V; Rated_current_min_no_of_poles_TU_20_deg_C: 32 A; PackageReference: RSV1_6_LS_09; Colour: Pebble grey; Packaging: Box; Qty: 50 PCS; Revision: V1; ComponentLink1Description: Manufacturer URL; ComponentLink1URL: http://www.weidmueller.com/; ComponentLink2Description: URL Link1; ComponentLink2URL: http://catalog.weidmueller.com/catalog/Start.do?localeId=en&ObjectID=1442500000
footprint RSV1_6_LS_09 (OMNIMATE Signal - Serie RSV  RSV1,6 LS9 GR 3,2)
part A pins: A1
part B pins: A2
part C pins: A3
part D pins: A4
part E pins: A5
part F pins: A6
part G pins: A7
part H pins: A8
part I pins: A9

## 1442600000
designator J?
OMNIMATE Signal - series RSV; PartNumber: 1442600000; Manufacturer: Weidmueller; Short_text_for_material: RSV1,6 LBF9 GR 3,2 AU; Pitch_mm: 5 mm; Pitch_inch: 0.197 inch; No_of_poles: 9; Solder_pin_length_mm: 3.2 mm; Contact_material: Cu-Leg; Contact_surface: Gold-plated; Insulating_material: Wemid (PA); UL_94_flammability_rating: V-0; Rated_voltage_for_surge_voltage_class_pollution_degree_II_2: 500 V; Rated_current_min_no_of_poles_TU_20_deg_C: 32 A; PackageReference: RSV1_6_LBF_09; Colour: Pebble grey; Packaging: Box; Qty: 50 PCS; Revision: V1; ComponentLink1Description: Manufacturer URL; ComponentLink1URL: http://www.weidmueller.com/; ComponentLink2Description: URL Link1; ComponentLink2URL: http://catalog.weidmueller.com/catalog/Start.do?localeId=en&ObjectID=1442600000
footprint RSV1_6_LBF_09 (OMNIMATE Signal - Serie RSV  RSV1,6 LBF9 GR 3,2)
pins: A1, A2, A3, A4, A5, A6, A7, A8, A9

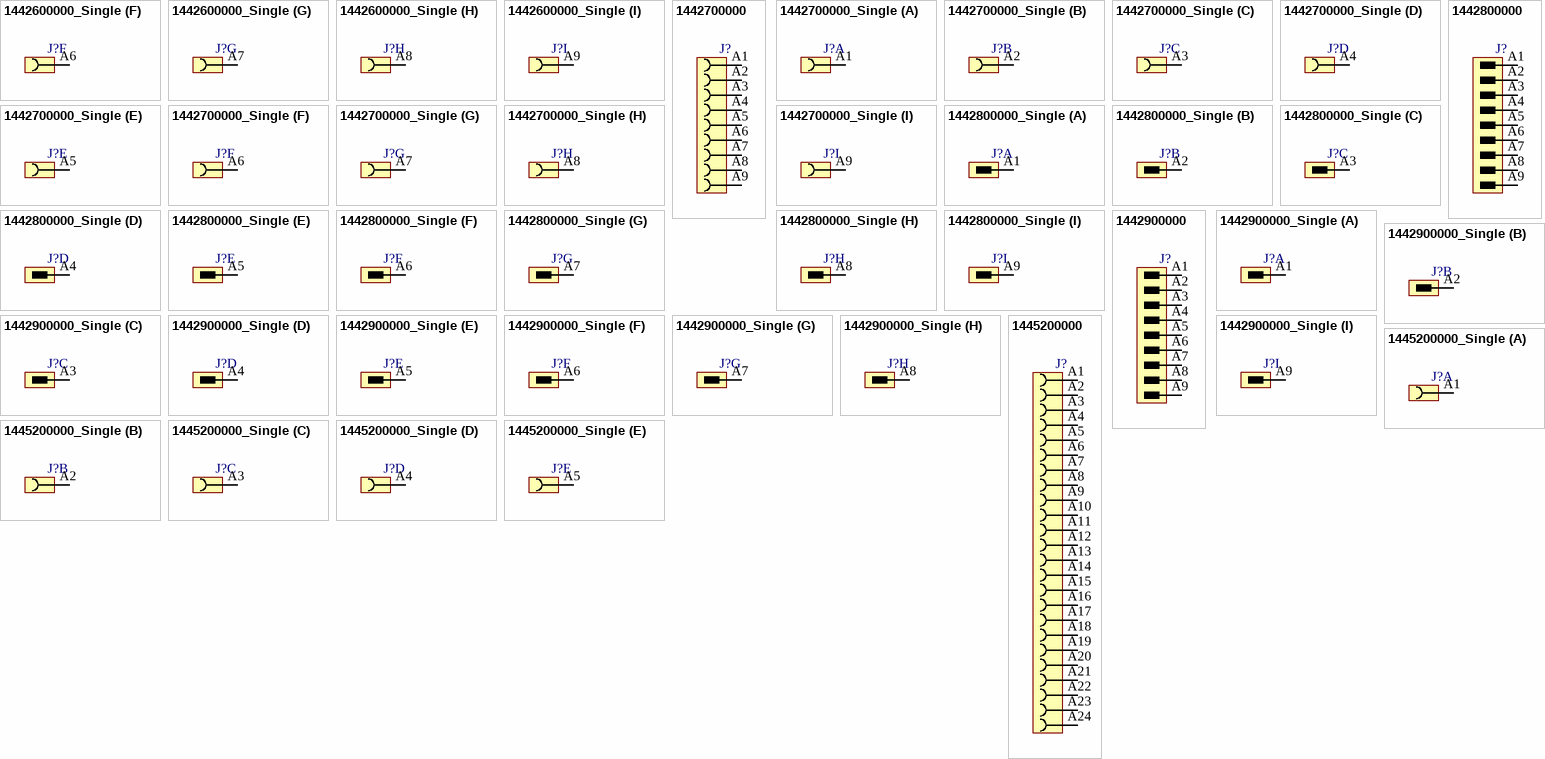
[diagram p66: symbols 1442600000_Single to 1445200000_Single]

## 1442600000_Single
designator J?
OMNIMATE Signal - series RSV; PartNumber: 1442600000; Manufacturer: Weidmueller; Short_text_for_material: RSV1,6 LBF9 GR 3,2 AU; Pitch_mm: 5 mm; Pitch_inch: 0.197 inch; No_of_poles: 9; Solder_pin_length_mm: 3.2 mm; Contact_material: Cu-Leg; Contact_surface: Gold-plated; Insulating_material: Wemid (PA); UL_94_flammability_rating: V-0; Rated_voltage_for_surge_voltage_class_pollution_degree_II_2: 500 V; Rated_current_min_no_of_poles_TU_20_deg_C: 32 A; PackageReference: RSV1_6_LBF_09; Colour: Pebble grey; Packaging: Box; Qty: 50 PCS; Revision: V1; ComponentLink1Description: Manufacturer URL; ComponentLink1URL: http://www.weidmueller.com/; ComponentLink2Description: URL Link1; ComponentLink2URL: http://catalog.weidmueller.com/catalog/Start.do?localeId=en&ObjectID=1442600000
footprint RSV1_6_LBF_09 (OMNIMATE Signal - Serie RSV  RSV1,6 LBF9 GR 3,2)
part A pins: A1
part B pins: A2
part C pins: A3
part D pins: A4
part E pins: A5
part F pins: A6
part G pins: A7
part H pins: A8
part I pins: A9